# Altium integrated library ALTIUM-TBL_2_50_382_HORIZONTAL_PCB_HEADER_69138201000X-rev17a.IntLib: 32 symbols
Pins are listed as number, name and electrical type; pins without a type are passive.

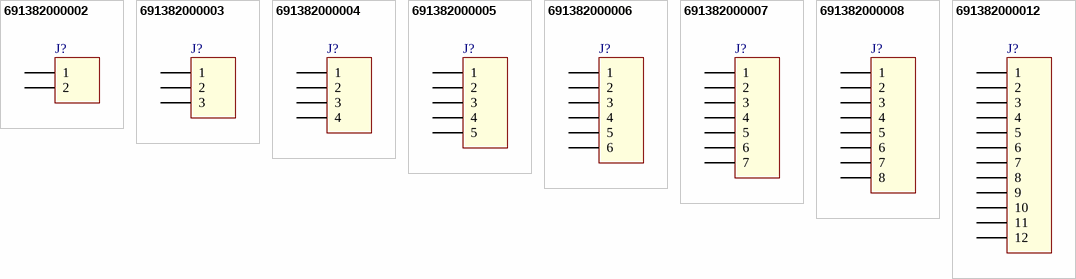
[diagram p0: symbols 691382000002 to 691382000012]

## 691382000002
designator J?
WR-TBL Serie 382 - 2.50 mm Vertical PCB Header, 02p; Part Number: 691382000002; Pitch: 2.5 mm; ComponentLink1Description: Manufacturer; ComponentLink1URL: http://www.we-online.de; ComponentLink2Description: Datasheet; ComponentLink2URL: http://katalog.we-online.de/em/datasheet/6913820000xx.pdf; Published Date: Jan 2017; Publisher: Wurth Elektronik; Pin Number: 02p
footprint 691382000002
pins: 1, 2

## 691382000003
designator J?
WR-TBL Serie 382 - 2.50 mm Vertical PCB Header, 03p; Part Number: 691382000003; Pitch: 2.5 mm; ComponentLink1Description: Manufacturer; ComponentLink1URL: http://www.we-online.de; ComponentLink2Description: Datasheet; ComponentLink2URL: http://katalog.we-online.de/em/datasheet/6913820000xx.pdf; Published Date: Jan 2017; Publisher: Wurth Elektronik; Pin Number: 03p
footprint 691382000003
pins: 1, 2, 3

## 691382000004
designator J?
WR-TBL Serie 382 - 2.50 mm Vertical PCB Header, 04p; Part Number: 691382000004; Pitch: 2.5 mm; ComponentLink1Description: Manufacturer; ComponentLink1URL: http://www.we-online.de; ComponentLink2Description: Datasheet; ComponentLink2URL: http://katalog.we-online.de/em/datasheet/6913820000xx.pdf; Published Date: Jan 2017; Publisher: Wurth Elektronik; Pin Number: 04p
footprint 691382000004
pins: 1, 2, 3, 4

## 691382000005
designator J?
WR-TBL Serie 382 - 2.50 mm Vertical PCB Header, 05p; Part Number: 691382000005; Pitch: 2.5 mm; ComponentLink1Description: Manufacturer; ComponentLink1URL: http://www.we-online.de; ComponentLink2Description: Datasheet; ComponentLink2URL: http://katalog.we-online.de/em/datasheet/6913820000xx.pdf; Published Date: Jan 2017; Publisher: Wurth Elektronik; Pin Number: 05p
footprint 691382000005
pins: 1, 2, 3, 4, 5

## 691382000006
designator J?
WR-TBL Serie 382 - 2.50 mm Vertical PCB Header, 06p; Part Number: 691382000006; Pitch: 2.5 mm; ComponentLink1Description: Manufacturer; ComponentLink1URL: http://www.we-online.de; ComponentLink2Description: Datasheet; ComponentLink2URL: http://katalog.we-online.de/em/datasheet/6913820000xx.pdf; Published Date: Jan 2017; Publisher: Wurth Elektronik; Pin Number: 06p
footprint 691382000006
pins: 1, 2, 3, 4, 5, 6

## 691382000007
designator J?
WR-TBL Serie 382 - 2.50 mm Vertical PCB Header, 07p; Part Number: 691382000007; Pitch: 2.5 mm; ComponentLink1Description: Manufacturer; ComponentLink1URL: http://www.we-online.de; ComponentLink2Description: Datasheet; ComponentLink2URL: http://katalog.we-online.de/em/datasheet/6913820000xx.pdf; Published Date: Jan 2017; Publisher: Wurth Elektronik; Pin Number: 07p
footprint 691382000007
pins: 1, 2, 3, 4, 5, 6, 7

## 691382000008
designator J?
WR-TBL Serie 382 - 2.50 mm Vertical PCB Header, 08p; Part Number: 691382000008; Pitch: 2.5 mm; ComponentLink1Description: Manufacturer; ComponentLink1URL: http://www.we-online.de; ComponentLink2Description: Datasheet; ComponentLink2URL: http://katalog.we-online.de/em/datasheet/6913820000xx.pdf; Published Date: Jan 2017; Publisher: Wurth Elektronik; Pin Number: 08p
footprint 691382000008
pins: 1, 2, 3, 4, 5, 6, 7, 8

## 691382000012
designator J?
WR-TBL Serie 382 - 2.50 mm Vertical PCB Header, 12p; Part Number: 691382000012; Pitch: 2.5 mm; ComponentLink1Description: Manufacturer; ComponentLink1URL: http://www.we-online.de; ComponentLink2Description: Datasheet; ComponentLink2URL: http://katalog.we-online.de/em/datasheet/6913820000xx.pdf; Published Date: Jan 2017; Publisher: Wurth Elektronik; Pin Number: 12p
footprint 691382000012 (Vertical PCB Header, pitch 2.5mm, 12p)
pins: 1, 2, 3, 4, 5, 6, 7, 8, 9, 10, 11, 12


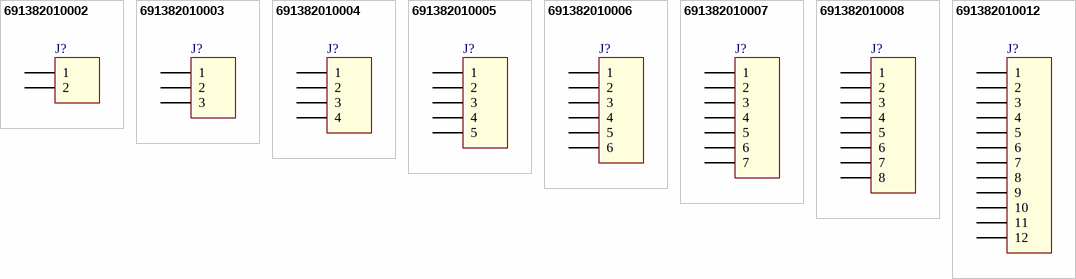
[diagram p1: symbols 691382010002 to 691382010012]

## 691382010002
designator J?
WR-TBL Serie 382 - 2.50 mm Horizontal PCB Header, 02p; Part Number: 691382010002; Pitch: 2.5 mm; ComponentLink1Description: Manufacturer; ComponentLink1URL: http://www.we-online.de; ComponentLink2Description: Datasheet; ComponentLink2URL: http://katalog.we-online.de/em/datasheet/6913820100xx.pdf; Published Date: Jan 2017; Publisher: Wurth Elektronik; Pin Number: 02p
footprint 691382010002
pins: 1, 2

## 691382010003
designator J?
WR-TBL Serie 382 - 2.50 mm Horizontal PCB Header, 03p; Part Number: 691382010003; Pitch: 2.5 mm; ComponentLink1Description: Manufacturer; ComponentLink1URL: http://www.we-online.de; ComponentLink2Description: Datasheet; ComponentLink2URL: http://katalog.we-online.de/em/datasheet/6913820100xx.pdf; Published Date: Jan 2017; Publisher: Wurth Elektronik; Pin Number: 03p
footprint 691382010003
pins: 1, 2, 3

## 691382010004
designator J?
WR-TBL Serie 382 - 2.50 mm Horizontal PCB Header, 04p; Part Number: 691382010004; Pitch: 2.5 mm; ComponentLink1Description: Manufacturer; ComponentLink1URL: http://www.we-online.de; ComponentLink2Description: Datasheet; ComponentLink2URL: http://katalog.we-online.de/em/datasheet/6913820100xx.pdf; Published Date: Jan 2017; Publisher: Wurth Elektronik; Pin Number: 04p
footprint 691382010004
pins: 1, 2, 3, 4

## 691382010005
designator J?
WR-TBL Serie 382 - 2.50 mm Horizontal PCB Header, 05p; Part Number: 691382010005; Pitch: 2.5 mm; ComponentLink1Description: Manufacturer; ComponentLink1URL: http://www.we-online.de; ComponentLink2Description: Datasheet; ComponentLink2URL: http://katalog.we-online.de/em/datasheet/6913820100xx.pdf; Published Date: Jan 2017; Publisher: Wurth Elektronik; Pin Number: 05p
footprint 691382010005
pins: 1, 2, 3, 4, 5

## 691382010006
designator J?
WR-TBL Serie 382 - 2.50 mm Horizontal PCB Header, 06p; Part Number: 691382010006; Pitch: 2.5 mm; ComponentLink1Description: Manufacturer; ComponentLink1URL: http://www.we-online.de; ComponentLink2Description: Datasheet; ComponentLink2URL: http://katalog.we-online.de/em/datasheet/6913820100xx.pdf; Published Date: Jan 2017; Publisher: Wurth Elektronik; Pin Number: 06p
footprint 691382010006
pins: 1, 2, 3, 4, 5, 6

## 691382010007
designator J?
WR-TBL Serie 382 - 2.50 mm Horizontal PCB Header, 07p; Part Number: 691382010007; Pitch: 2.5 mm; ComponentLink1Description: Manufacturer; ComponentLink1URL: http://www.we-online.de; ComponentLink2Description: Datasheet; ComponentLink2URL: http://katalog.we-online.de/em/datasheet/6913820100xx.pdf; Published Date: Jan 2017; Publisher: Wurth Elektronik; Pin Number: 07p
footprint 691382010007
pins: 1, 2, 3, 4, 5, 6, 7

## 691382010008
designator J?
WR-TBL Serie 382 - 2.50 mm Horizontal PCB Header, 08p; Part Number: 691382010008; Pitch: 2.5 mm; ComponentLink1Description: Manufacturer; ComponentLink1URL: http://www.we-online.de; ComponentLink2Description: Datasheet; ComponentLink2URL: http://katalog.we-online.de/em/datasheet/6913820100xx.pdf; Published Date: Jan 2017; Publisher: Wurth Elektronik; Pin Number: 08p
footprint 691382010008
pins: 1, 2, 3, 4, 5, 6, 7, 8

## 691382010012
designator J?
WR-TBL Serie 382 - 2.50 mm Horizontal PCB Header, 12p; Part Number: 691382010012; Pitch: 2.5 mm; ComponentLink1Description: Manufacturer; ComponentLink1URL: http://www.we-online.de; ComponentLink2Description: Datasheet; ComponentLink2URL: http://katalog.we-online.de/em/datasheet/6913820100xx.pdf; Published Date: Jan 2017; Publisher: Wurth Elektronik; Pin Number: 12p
footprint 691382010012
pins: 1, 2, 3, 4, 5, 6, 7, 8, 9, 10, 11, 12


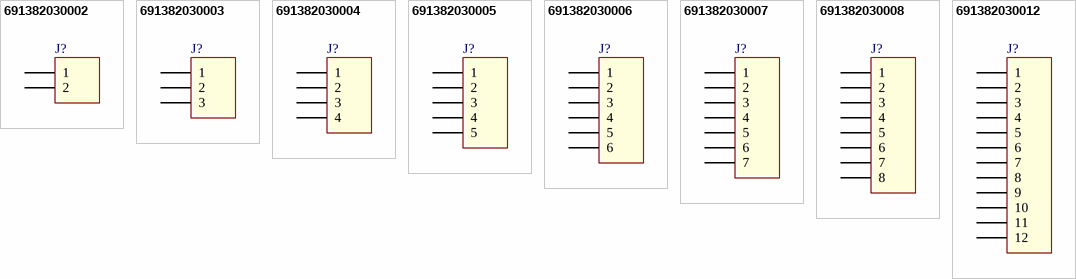
[diagram p2: symbols 691382030002 to 691382030012]

## 691382030002
designator J?
WR-TBL Serie 382 - 2.50 mm Vertical PCB Header with Flanges, 02p; Part Number: 691382030002; Pitch: 2.5 mm; ComponentLink1Description: Manufacturer; ComponentLink1URL: http://www.we-online.de; ComponentLink2Description: Datasheet; ComponentLink2URL: http://katalog.we-online.de/em/datasheet/6913820300xx.pdf; Published Date: Jan 2017; Publisher: Wurth Elektronik; Pin Number: 02p
footprint 691382030002
pins: 1, 2

## 691382030003
designator J?
WR-TBL Serie 382 - 2.50 mm Vertical PCB Header with Flanges, 03p; Part Number: 691382030003; Pitch: 2.5 mm; ComponentLink1Description: Manufacturer; ComponentLink1URL: http://www.we-online.de; ComponentLink2Description: Datasheet; ComponentLink2URL: http://katalog.we-online.de/em/datasheet/6913820300xx.pdf; Published Date: Jan 2017; Publisher: Wurth Elektronik; Pin Number: 03p
footprint 691382030003
pins: 1, 2, 3

## 691382030004
designator J?
WR-TBL Serie 382 - 2.50 mm Vertical PCB Header with Flanges, 04p; Part Number: 691382030004; Pitch: 2.5 mm; ComponentLink1Description: Manufacturer; ComponentLink1URL: http://www.we-online.de; ComponentLink2Description: Datasheet; ComponentLink2URL: http://katalog.we-online.de/em/datasheet/6913820300xx.pdf; Published Date: Jan 2017; Publisher: Wurth Elektronik; Pin Number: 04p
footprint 691382030004
pins: 1, 2, 3, 4

## 691382030005
designator J?
WR-TBL Serie 382 - 2.50 mm Vertical PCB Header with Flanges, 05p; Part Number: 691382030005; Pitch: 2.5 mm; ComponentLink1Description: Manufacturer; ComponentLink1URL: http://www.we-online.de; ComponentLink2Description: Datasheet; ComponentLink2URL: http://katalog.we-online.de/em/datasheet/6913820300xx.pdf; Published Date: Jan 2017; Publisher: Wurth Elektronik; Pin Number: 05p
footprint 691382030005
pins: 1, 2, 3, 4, 5

## 691382030006
designator J?
WR-TBL Serie 382 - 2.50 mm Vertical PCB Header with Flanges, 06p; Part Number: 691382030006; Pitch: 2.5 mm; ComponentLink1Description: Manufacturer; ComponentLink1URL: http://www.we-online.de; ComponentLink2Description: Datasheet; ComponentLink2URL: http://katalog.we-online.de/em/datasheet/6913820300xx.pdf; Published Date: Jan 2017; Publisher: Wurth Elektronik; Pin Number: 06p
footprint 691382030006
pins: 1, 2, 3, 4, 5, 6

## 691382030007
designator J?
WR-TBL Serie 382 - 2.50 mm Vertical PCB Header with Flanges, 07p; Part Number: 691382030007; Pitch: 2.5 mm; ComponentLink1Description: Manufacturer; ComponentLink1URL: http://www.we-online.de; ComponentLink2Description: Datasheet; ComponentLink2URL: http://katalog.we-online.de/em/datasheet/6913820300xx.pdf; Published Date: Jan 2017; Publisher: Wurth Elektronik; Pin Number: 07p
footprint 691382030007
pins: 1, 2, 3, 4, 5, 6, 7

## 691382030008
designator J?
WR-TBL Serie 382 - 2.50 mm Vertical PCB Header with Flanges, 08p; Part Number: 691382030008; Pitch: 2.5 mm; ComponentLink1Description: Manufacturer; ComponentLink1URL: http://www.we-online.de; ComponentLink2Description: Datasheet; ComponentLink2URL: http://katalog.we-online.de/em/datasheet/6913820300xx.pdf; Published Date: Jan 2017; Publisher: Wurth Elektronik; Pin Number: 08p
footprint 691382030008
pins: 1, 2, 3, 4, 5, 6, 7, 8

## 691382030012
designator J?
WR-TBL Serie 382 - 2.50 mm Vertical PCB Header with Flanges, 12p; Part Number: 691382030012; Pitch: 2.5 mm; ComponentLink1Description: Manufacturer; ComponentLink1URL: http://www.we-online.de; ComponentLink2Description: Datasheet; ComponentLink2URL: http://katalog.we-online.de/em/datasheet/6913820300xx.pdf; Published Date: Jan 2017; Publisher: Wurth Elektronik; Pin Number: 12p
footprint 691382030012
pins: 1, 2, 3, 4, 5, 6, 7, 8, 9, 10, 11, 12


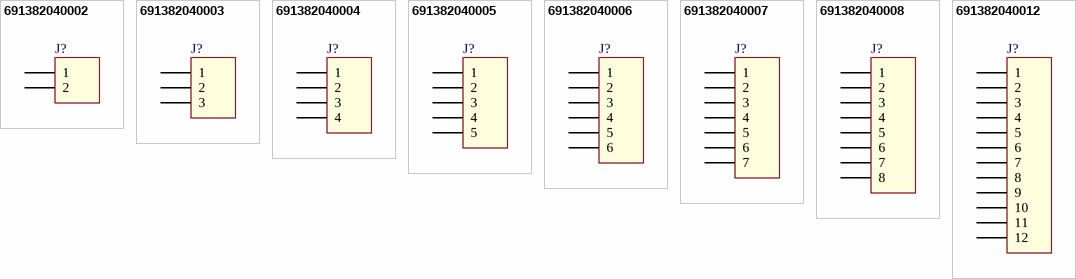
[diagram p3: symbols 691382040002 to 691382040012]

## 691382040002
designator J?
WR-TBL Serie 382 - 2.50 mm Horizontal PCB Header with Flanges, 02p; Part Number: 691382040002; Pitch: 2.5 mm; ComponentLink1Description: Manufacturer; ComponentLink1URL: http://www.we-online.de; ComponentLink2Description: Datasheet; ComponentLink2URL: http://katalog.we-online.de/em/datasheet/6913820400xx.pdf; Published Date: Jan 2017; Publisher: Wurth Elektronik; Pin Number: 02p
footprint 691382040002
pins: 1, 2

## 691382040003
designator J?
WR-TBL Serie 382 - 2.50 mm Horizontal PCB Header with Flanges, 03p; Part Number: 691382040003; Pitch: 2.5 mm; ComponentLink1Description: Manufacturer; ComponentLink1URL: http://www.we-online.de; ComponentLink2Description: Datasheet; ComponentLink2URL: http://katalog.we-online.de/em/datasheet/6913820400xx.pdf; Published Date: Jan 2017; Publisher: Wurth Elektronik; Pin Number: 03p
footprint 691382040003
pins: 1, 2, 3

## 691382040004
designator J?
WR-TBL Serie 382 - 2.50 mm Horizontal PCB Header with Flanges, 04p; Part Number: 691382040004; Pitch: 2.5 mm; ComponentLink1Description: Manufacturer; ComponentLink1URL: http://www.we-online.de; ComponentLink2Description: Datasheet; ComponentLink2URL: http://katalog.we-online.de/em/datasheet/6913820400xx.pdf; Published Date: Jan 2017; Publisher: Wurth Elektronik; Pin Number: 04p
footprint 691382040004
pins: 1, 2, 3, 4

## 691382040005
designator J?
WR-TBL Serie 382 - 2.50 mm Horizontal PCB Header with Flanges, 05p; Part Number: 691382040005; Pitch: 2.5 mm; ComponentLink1Description: Manufacturer; ComponentLink1URL: http://www.we-online.de; ComponentLink2Description: Datasheet; ComponentLink2URL: http://katalog.we-online.de/em/datasheet/6913820400xx.pdf; Published Date: Jan 2017; Publisher: Wurth Elektronik; Pin Number: 05p
footprint 691382040005
pins: 1, 2, 3, 4, 5

## 691382040006
designator J?
WR-TBL Serie 382 - 2.50 mm Horizontal PCB Header with Flanges, 06p; Part Number: 691382040006; Pitch: 2.5 mm; ComponentLink1Description: Manufacturer; ComponentLink1URL: http://www.we-online.de; ComponentLink2Description: Datasheet; ComponentLink2URL: http://katalog.we-online.de/em/datasheet/6913820400xx.pdf; Published Date: Jan 2017; Publisher: Wurth Elektronik; Pin Number: 06p
footprint 691382040006
pins: 1, 2, 3, 4, 5, 6

## 691382040007
designator J?
WR-TBL Serie 382 - 2.50 mm Horizontal PCB Header with Flanges, 07p; Part Number: 691382040007; Pitch: 2.5 mm; ComponentLink1Description: Manufacturer; ComponentLink1URL: http://www.we-online.de; ComponentLink2Description: Datasheet; ComponentLink2URL: http://katalog.we-online.de/em/datasheet/6913820400xx.pdf; Published Date: Jan 2017; Publisher: Wurth Elektronik; Pin Number: 07p
footprint 691382040007
pins: 1, 2, 3, 4, 5, 6, 7

## 691382040008
designator J?
WR-TBL Serie 382 - 2.50 mm Horizontal PCB Header with Flanges, 08p; Part Number: 691382040008; Pitch: 2.5 mm; ComponentLink1Description: Manufacturer; ComponentLink1URL: http://www.we-online.de; ComponentLink2Description: Datasheet; ComponentLink2URL: http://katalog.we-online.de/em/datasheet/6913820400xx.pdf; Published Date: Jan 2017; Publisher: Wurth Elektronik; Pin Number: 08p
footprint 691382040008
pins: 1, 2, 3, 4, 5, 6, 7, 8

## 691382040012
designator J?
WR-TBL Serie 382 - 2.50 mm Horizontal PCB Header with Flanges, 12p; Part Number: 691382040012; Pitch: 2.5 mm; ComponentLink1Description: Manufacturer; ComponentLink1URL: http://www.we-online.de; ComponentLink2Description: Datasheet; ComponentLink2URL: http://katalog.we-online.de/em/datasheet/6913820400xx.pdf; Published Date: Jan 2017; Publisher: Wurth Elektronik; Pin Number: 12p
footprint 691382040012
pins: 1, 2, 3, 4, 5, 6, 7, 8, 9, 10, 11, 12